# Altium footprint library Connectors.PcbLib: 101 footprints (part 4 of 7)
Each footprint in its own frame and in the unit in brackets; x right, y up, seen from the top. Pads: shape width x height; smd on the part's side, far side on the other; paste and mask are expansions set on the pad; w line width, h text height; cw(c..) or ccw(c..) is an arc to the next point about the centre after c.
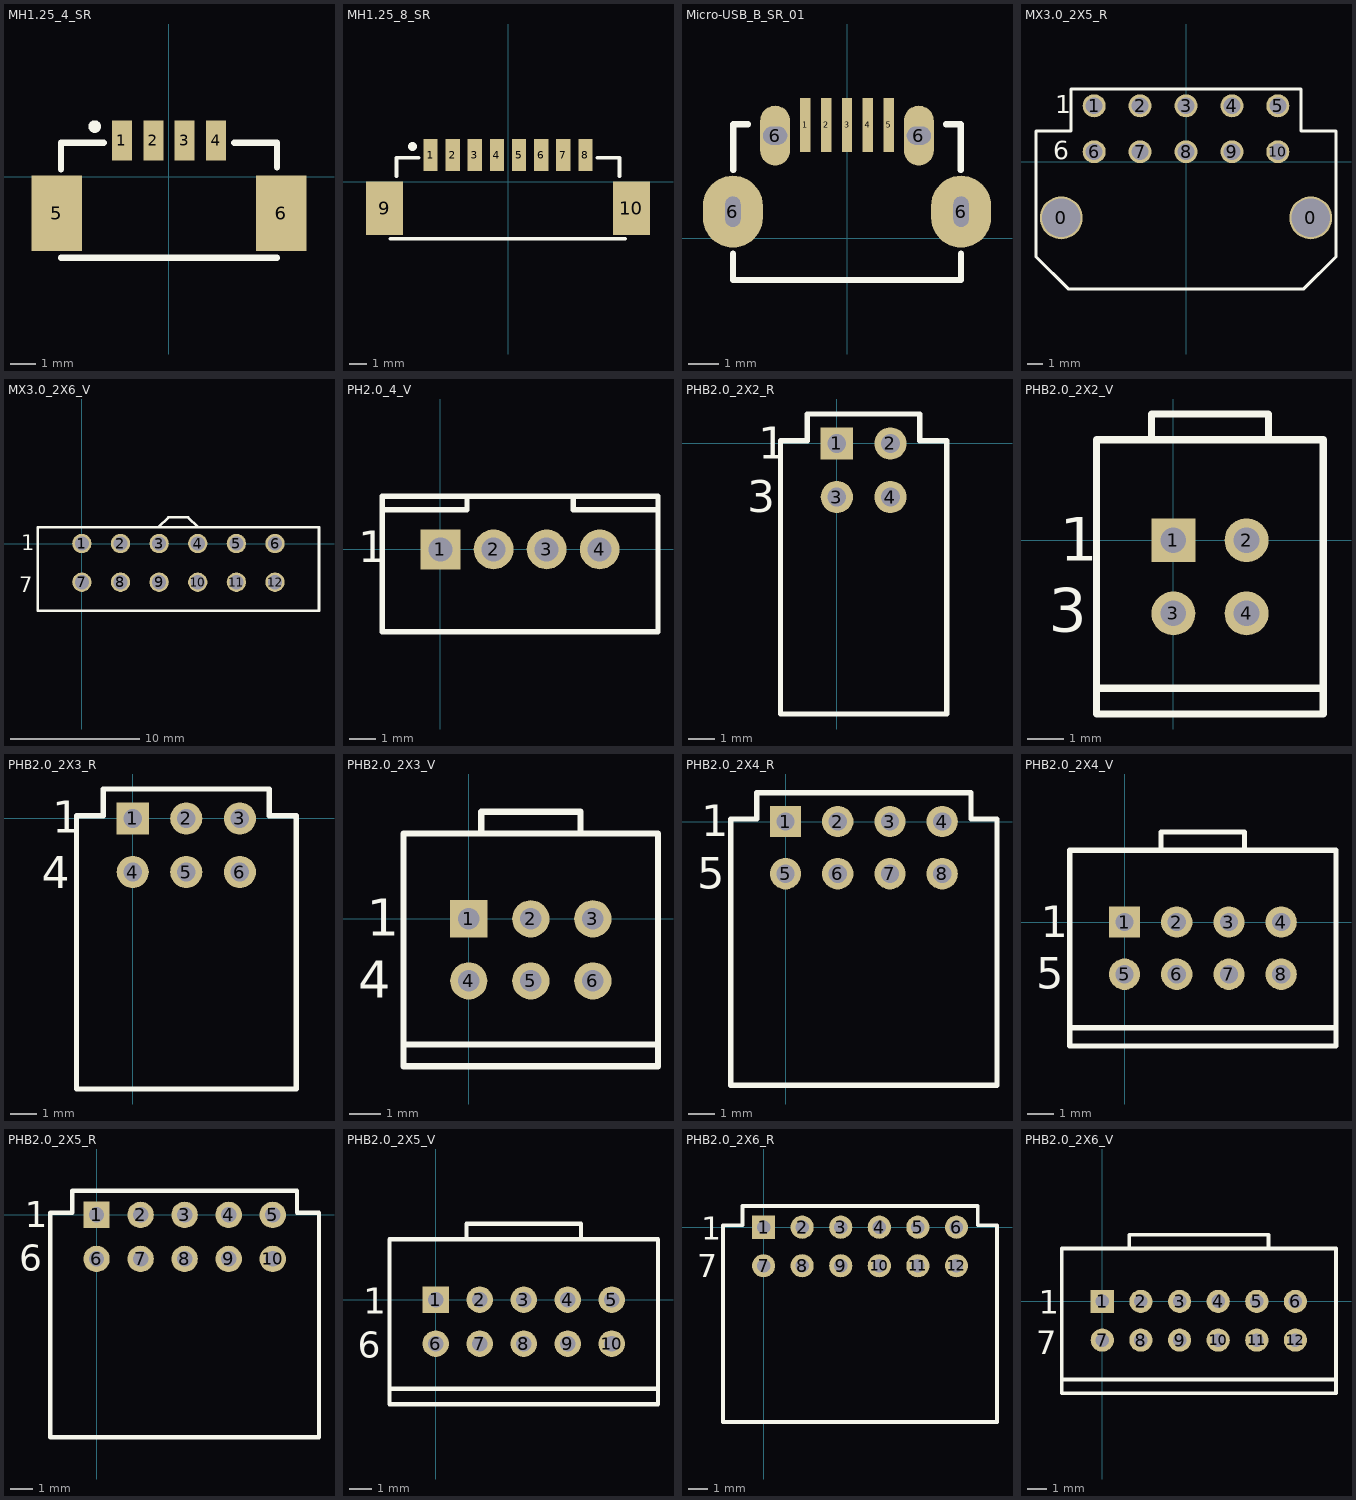
[diagram p3: the footprints below, top view; thin cyan lines are the x and y axes]

## MH1.25_4_SR [mm] "SH/MH Connector, 1.25mm Pitch, 4 Pin, Surface mount, Right angle"
pads (6):
  rect 0.8x1.6 smd: 1(-1.875,1.45) 2(-0.625,1.45) 3(0.625,1.45) 4(1.875,1.45)
  rect 2x3 smd: 5(-4.475,-1.45) 6(4.475,-1.45)
Top Overlay:
  circle w0.25: c-2.96,2 r0.125
  lines w0.254: -4.3,-3.225 4.3,-3.225 ; -4.3,0.3 -4.3,1.35 -2.6,1.35 ; 2.6,1.35 4.3,1.35 4.3,0.375
3D body "532610471.stp": height 3.4, standoff 0, extent -5.075,-3.22 5.075,1.98

## MH1.25_8_SR [mm] "SH/MH Connector, 1.25mm Pitch, 8 Pin, Surface mount, Right angle"
pads (10):
  rect 0.8x1.8 smd: 1(-4.375,1.5) 2(-3.125,1.5) 3(-1.875,1.5) 4(-0.625,1.5) 5(0.625,1.5) 6(1.875,1.5) 7(3.125,1.5) 8(4.375,1.5)
  rect 2.1x3 smd: 9(-6.975,-1.5) 10(6.975,-1.5)
Top Overlay:
  circle w0.25: c-5.395,1.99 r0.125
  lines w0.2: -6.66,-3.225 6.62,-3.225 ; -6.3,0.3 -6.3,1.35 ; -6.29,1.35 -5.05,1.35 ; 5.05,1.35 6.3,1.35 6.3,0.3
3D body "532610871.stp": height 3.35, standoff -0.05, extent -7.635,-3.22 7.515,1.98

## Micro-USB_B_SR_01 [mm] "Micro-USB, Type B Receptacle, Bottom Mount, Surface Mount"
height 2
pads (9):
  rect 0.35x1.8 smd: 1(-1.4,3.789) 2(-0.7,3.789) 3(0,3.789) 4(0.7,3.789) 5(1.4,3.789)
  oval 2x2.4 hole 0.508 slot 1.016 at 90 deg: 6(-3.81,0.889) 6(3.81,0.889)
  oval 1x2 hole 0.6 slot 0.8 at 0 deg: 6(-2.4,3.429) 6(2.4,3.429)
Top Overlay:
  lines w0.203: -3.81,-0.508 -3.81,-1.397 3.81,-1.397 3.81,-0.508 ; -3.8,2.286 -3.8,3.81 -3.302,3.81 ; 3.302,3.81 3.8,3.81 3.8,2.286
3D body "1050170001.stp": height 2.73, standoff -0.58, extent -4.1,-1.734 4.1,3.666

## MX3.0_2X5_R [mm] "MX3.0 Connector , 3.0mm Pitch, 5-Pin, Dual row, Right angle"
height 5
pads (12):
  round 2.8 hole 2.5: 0(-8.15,-3.66) 0(8.15,-3.66)
  round 1.5 hole 1.1: 1(-6,3.66) 2(-3,3.66) 3(0,3.66) 4(3,3.66) 5(6,3.66) 6(-6,0.66) 7(-3,0.66) 8(0,0.66) 9(3,0.66) 10(6,0.66)
Top Overlay:
  lines w0.2: -9.8,-6.2 -9.8,-4.549 -9.8,2 -7.5,2 -7.5,4.75 7.5,4.75 7.5,2 9.8,2 9.8,-6.2 7.7,-8.3 -7.7,-8.3 -9.8,-6.2
  text "1" at -8.53,3.19 h1.2
  text "6" at -8.67,0.16 h1.2
3D body "430451021.stp": height 8.38, standoff -3.57, extent -9.625,-8.24 9.575,4

## MX3.0_2X6_V [mm] "MX3.0 Connector , 3.0mm Pitch, 6-Pin, Dual row, Vertical"
pads (12):
  round 1.5 hole 1.1: 1(0,0) 2(3,0) 3(6,0) 4(9,0) 5(12,0) 6(15,0) 7(0,-3) 8(3,-3) 9(6,-3) 10(9,-3) 11(12,-3) 12(15,-3)
Top Overlay:
  lines w0.2: 5.969,1.27 6.731,2.032 8.255,2.032 9.017,1.27 ; -3.429,-5.207 -3.429,1.27 18.415,1.27 18.415,-5.207 -3.429,-5.207
  text "7" at -4.88,-3.78 h1.2
  text "1" at -4.71,-0.52 h1.2
3D body "430451225.stp": height 9.95, standoff -3.14, extent -3.608,-5.468 18.542,3.302

## PH2.0_4_V [mm] "PH Connector, 2.0mm Pitch, 4-Pin, Vertical"
pads (4):
  rect 1.5x1.5 hole 0.9 paste+0 mask+0.1: 1(0,0)
  round 1.5 hole 0.9 paste+0 mask+0.1: 2(2,0) 3(4,0) 4(6,0)
Top Overlay:
  lines w0.2: -2.2,1.5 1,1.5 1,2 ; 5,2 5,1.5 8.2,1.5 ; -2.2,-3.1 8.2,-3.1 8.2,2 -2.2,2 -2.2,-3.1
  text "1" at -3.11,-0.49 h1.2
3D body "B4B-PH-K-S.STEP": height 6, standoff -3.4, extent -1.95,-2.8 7.95,1.7

## PHB2.0_2X2_R [mm] "PHB2.0 , 2-Pin, Dual row, Right Angle"
pads (4):
  rect 1.2x1.2 hole 0.7 paste+0 mask+0.1: 1(0,0)
  round 1.2 hole 0.7 paste+0 mask+0.1: 2(2,0) 3(0,-2) 4(2,-2)
Top Overlay:
  lines w0.2: -1.1,1.1 -1.1,0.1 -2.1,0.1 -2.1,-10.1 4.1,-10.1 4.1,0.1 3.1,0.1 3.1,1.1 -1.09,1.1
  text "3" at -3.34,-2.56 h1.2
  text "1" at -2.93,-0.58 h1.2
3D body "878330419.stp": height 7.25, standoff -1.21, extent -2.325,-8.4 4.325,0.25

## PHB2.0_2X2_V [mm] "PHB2.0 , 2-Pin, Dual row, Vertical"
pads (4):
  rect 1.2x1.2 hole 0.7 paste+0 mask+0.1: 1(0,0)
  round 1.2 hole 0.7 paste+0 mask+0.1: 2(2,0) 3(0,-2) 4(2,-2)
Top Overlay:
  lines w0.2: -2.1,-4.05 4.1,-4.05 ; -0.6,2.755 -0.6,3.45 2.6,3.45 2.6,2.765 ; -2.1,-4.75 4.1,-4.75 4.1,2.75 -2.1,2.75 -2.1,-4.75
  text "3" at -3.41,-2.5 h1.2
  text "1" at -3.11,-0.56 h1.2
3D body "878310419.stp": height 7.7, standoff -1.2, extent -2.325,-4.15 4.325,2.15

## PHB2.0_2X3_R [mm] "PHB2.0 , 3-Pin, Dual row, Right Angle"
pads (6):
  rect 1.2x1.2 hole 0.7 paste+0 mask+0.1: 1(0,0)
  round 1.2 hole 0.7 paste+0 mask+0.1: 2(2,0) 3(4,0) 4(0,-2) 5(2,-2) 6(4,-2)
Top Overlay:
  lines w0.2: -1.1,1.1 -1.1,0.1 -2.1,0.1 -2.1,-10.1 6.1,-10.1 6.1,0.1 5.1,0.1 5.1,1.1 -1.09,1.1
  text "1" at -3.01,-0.53 h1.2
  text "4" at -3.39,-2.61 h1.2
3D body "878330619.stp": height 7.25, standoff -1.21, extent -2.325,-8.4 6.325,0.25

## PHB2.0_2X3_V [mm] "PHB2.0 , 3-Pin, Dual row, Vertical"
pads (6):
  rect 1.2x1.2 hole 0.7 paste+0 mask+0.1: 1(0,0)
  round 1.2 hole 0.7 paste+0 mask+0.1: 2(2,0) 3(4,0) 4(0,-2) 5(2,-2) 6(4,-2)
Top Overlay:
  lines w0.2: -2.1,-4.05 6.1,-4.05 ; 0.4,2.755 0.4,3.45 3.6,3.45 3.6,2.765 ; -2.1,-4.75 -2.1,2.75 6.1,2.75 6.1,-4.75 -2.1,-4.75
  text "4" at -3.57,-2.54 h1.2
  text "1" at -3.29,-0.55 h1.2
3D body "878310619.stp": height 7.7, standoff -1.2, extent -2.325,-4.15 6.325,2.15

## PHB2.0_2X4_R [mm] "PHB2.0 , 4-Pin, Dual row, Right Angle"
pads (8):
  rect 1.2x1.2 hole 0.7 paste+0 mask+0.1: 1(0,0)
  round 1.2 hole 0.7 paste+0 mask+0.1: 2(2,0) 3(4,0) 4(6,0) 5(0,-2) 6(2,-2) 7(4,-2) 8(6,-2)
Top Overlay:
  lines w0.2: -1.1,1.1 -1.1,0.1 -2.1,0.1 -2.1,-10.1 8.1,-10.1 8.1,0.1 7.1,0.1 7.1,1.1 -1.09,1.1
  text "5" at -3.39,-2.57 h1.2
  text "1" at -3.23,-0.56 h1.2
3D body "878330819.stp": height 7.25, standoff -1.21, extent -2.325,-8.4 8.325,0.25

## PHB2.0_2X4_V [mm] "PHB2.0 , 4-Pin, Dual row, Vertical"
pads (8):
  rect 1.2x1.2 hole 0.7 paste+0 mask+0.1: 1(0,0)
  round 1.2 hole 0.7 paste+0 mask+0.1: 2(2,0) 3(4,0) 4(6,0) 5(0,-2) 6(2,-2) 7(4,-2) 8(6,-2)
Top Overlay:
  lines w0.2: -2.1,-4.05 8.1,-4.05 ; 1.4,2.755 1.4,3.45 4.6,3.45 4.6,2.765 ; -2.1,-4.75 8.1,-4.75 8.1,2.75 -2.1,2.75 -2.1,-4.75
  text "5" at -3.39,-2.55 h1.2
  text "1" at -3.21,-0.59 h1.2
3D body "878310819.stp": height 7.7, standoff -1.2, extent -2.325,-4.15 8.325,2.15

## PHB2.0_2X5_R [mm] "PHB2.0 , 5-Pin, Dual row, Right Angle"
pads (10):
  rect 1.2x1.2 hole 0.7 paste+0 mask+0.1: 1(0,0)
  round 1.2 hole 0.7 paste+0 mask+0.1: 2(2,0) 3(4,0) 4(6,0) 5(8,0) 6(0,-2) 7(2,-2) 8(4,-2) 9(6,-2) 10(8,-2)
Top Overlay:
  lines w0.2: -1.1,1.1 -1.1,0.1 -2.1,0.1 -2.1,-10.1 10.1,-10.1 10.1,0.1 9.1,0.1 9.1,1.1 -1.09,1.1
  text "6" at -3.52,-2.53 h1.2
  text "1" at -3.27,-0.56 h1.2
3D body "878331051.stp": height 7.25, standoff -0.75, extent -2.325,-8.4 10.325,0.25

## PHB2.0_2X5_V [mm] "PHB2.0 , 5-Pin, Dual row, Vertical"
pads (10):
  rect 1.2x1.2 hole 0.7 paste+0 mask+0.1: 1(0,0)
  round 1.2 hole 0.7 paste+0 mask+0.1: 2(2,0) 3(4,0) 4(6,0) 5(8,0) 6(0,-2) 7(2,-2) 8(4,-2) 9(6,-2) 10(8,-2)
Top Overlay:
  lines w0.2: -2.1,-4.05 10.1,-4.05 ; 1.4,2.755 1.4,3.45 6.6,3.45 6.6,2.765 ; -2.1,-4.75 -2.1,2.75 10.1,2.75 10.1,-4.75 -2.1,-4.75
  text "6" at -3.53,-2.64 h1.2
  text "1" at -3.29,-0.64 h1.2
3D body "878311019.stp": height 7.7, standoff -1.2, extent -2.325,-4.15 10.325,2.15

## PHB2.0_2X6_R [mm] "PHB2.0 , 6-Pin, Dual row, Right Angle"
pads (12):
  rect 1.2x1.2 hole 0.7 paste+0 mask+0.1: 1(0,0)
  round 1.2 hole 0.7 paste+0 mask+0.1: 2(2,0) 3(4,0) 4(6,0) 5(8,0) 6(10,0) 7(0,-2) 8(2,-2) 9(4,-2) 10(6,-2) 11(8,-2) 12(10,-2)
Top Overlay:
  lines w0.2: -1.1,1.1 -1.1,0.1 -2.1,0.1 -2.1,-10.1 12.1,-10.1 12.1,0.1 11.1,0.1 11.1,1.1 -1.09,1.1
  text "7" at -3.45,-2.59 h1.2
  text "1" at -3.24,-0.65 h1.2
3D body "878331231.stp": height 7.25, standoff -1.21, extent -2.325,-8.4 12.325,0.25

## PHB2.0_2X6_V [mm] "PHB2.0 , 6-Pin, Dual row, Vertical"
pads (12):
  rect 1.2x1.2 hole 0.7 paste+0 mask+0.1: 1(0,0)
  round 1.2 hole 0.7 paste+0 mask+0.1: 2(2,0) 3(4,0) 4(6,0) 5(8,0) 6(10,0) 7(0,-2) 8(2,-2) 9(4,-2) 10(6,-2) 11(8,-2) 12(10,-2)
Top Overlay:
  lines w0.2: -2.1,-4.05 12.1,-4.05 ; 1.4,2.755 1.4,3.45 8.6,3.45 8.6,2.765 ; -2.1,-4.75 -2.1,2.75 12.1,2.75 12.1,-4.75 -2.1,-4.75
  text "7" at -3.43,-2.74 h1.2
  text "1" at -3.3,-0.63 h1.2
3D body "878311219.stp": height 7.7, standoff -1.2, extent -2.325,-4.15 12.325,2.15